# Altium footprint library VESC_MotorController.PcbLib: 146 footprints (part 1 of 10)
Each footprint in its own frame and in the unit in brackets; x right, y up, seen from the top. Pads: shape width x height; smd on the part's side, far side on the other; paste and mask are expansions set on the pad; w line width, h text height; cw(c..) or ccw(c..) is an arc to the next point about the centre after c.
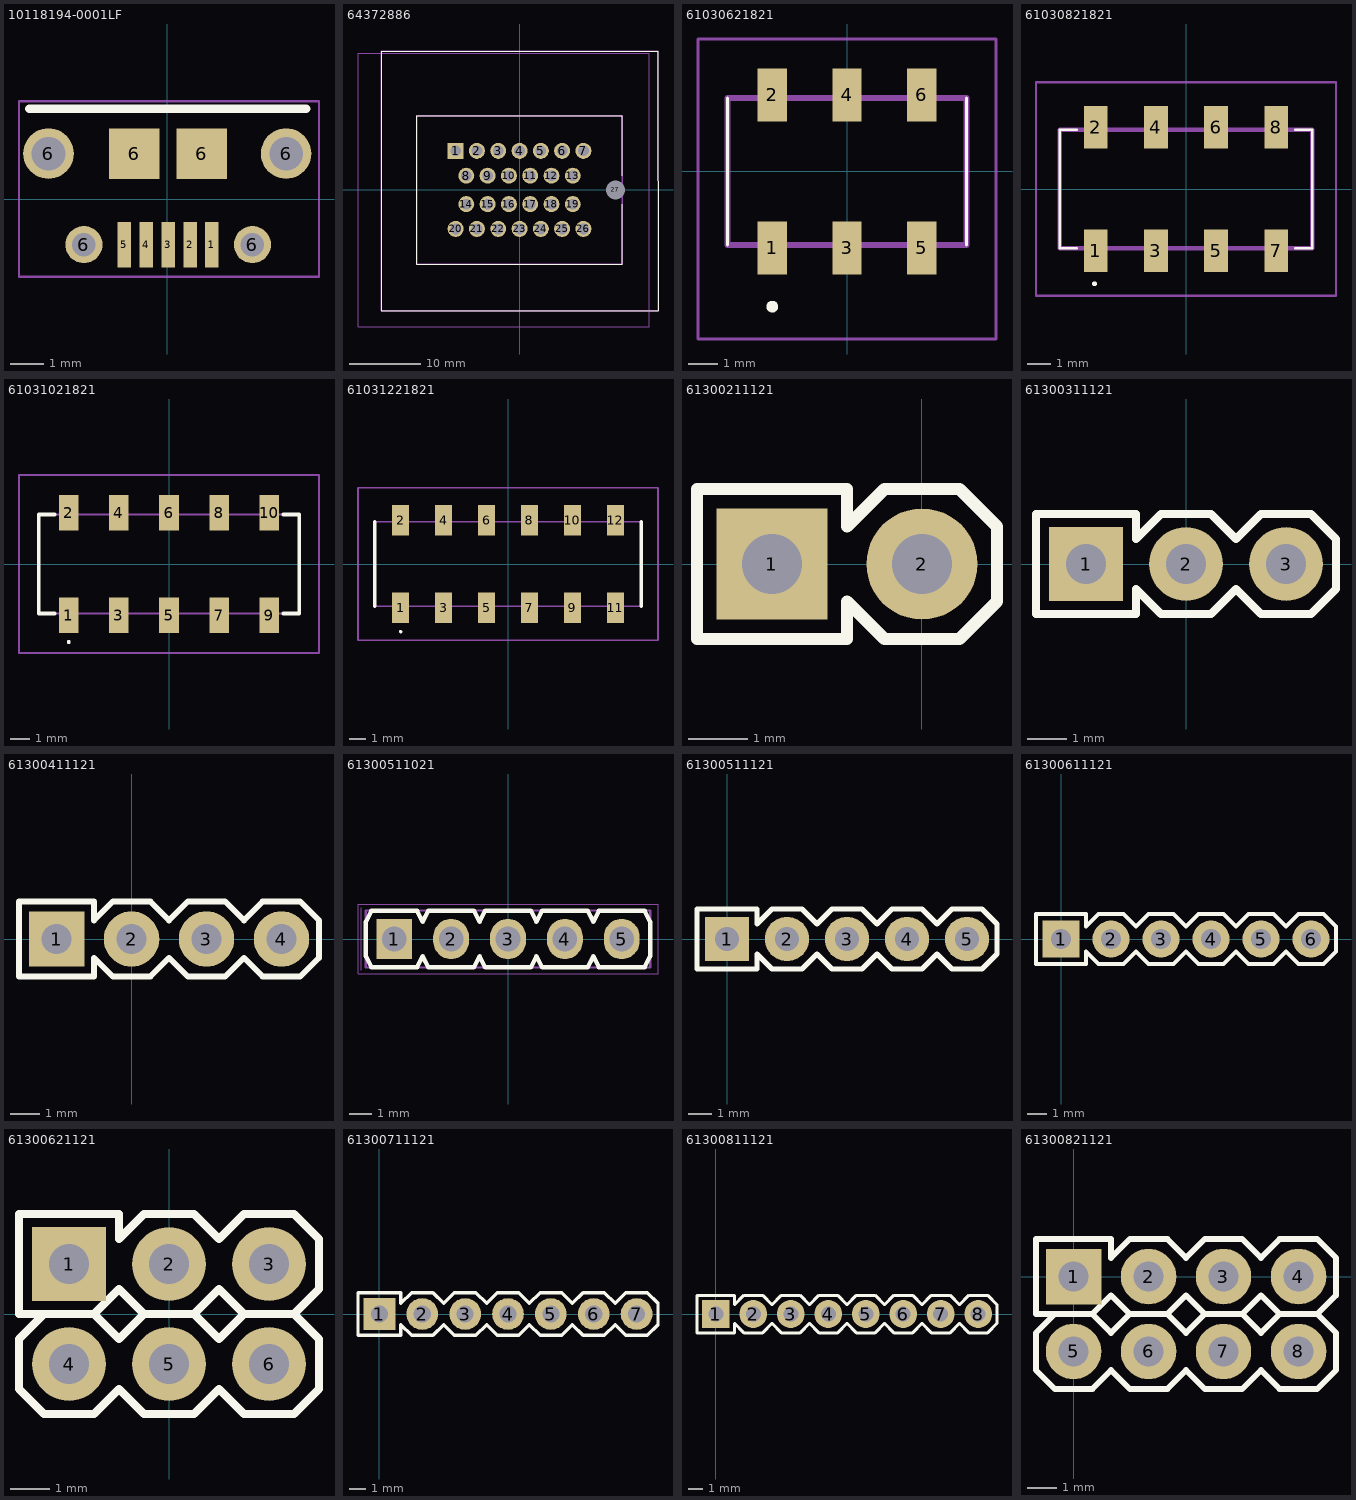
[diagram p0: the footprints below, top view; thin cyan lines are the x and y axes]

## 10118194-0001LF [mm] "CONN USB MICRO B RECPT SMT R/A"
pads (11):
  rect 0.4x1.35 smd: 1(1.325,-1.35) 2(0.675,-1.35) 3(0.025,-1.35) 4(-0.625,-1.35) 5(-1.275,-1.35)
  round 1.5 hole 1: 6(-3.525,1.35) 6(3.525,1.35)
  round 1.1 hole 0.7: 6(-2.475,-1.35) 6(2.525,-1.35)
  rect 1.5x1.5 smd: 6(-0.975,1.35) 6(1.025,1.35)
Top Overlay:
  lines w0.25: -4.1,2.675 4.125,2.675
Mechanical 15:
  lines w0.07: -4.4,-2.3 4.5,-2.3 4.5,2.9 -4.4,2.9 -4.4,-2.3
3D body "MICRO_USB_5PIN_0921_ASM.STEP": height 2.73, standoff -0.55, extent -4,-1.553 4.05,4.027

## 64372886 [mm]
pads (27):
  rect 2.25x2.25 hole 1.5: 1(-9,5.5)
  round 2.25 hole 1.5: 2(-6,5.5) 3(-3,5.5) 4(0,5.5) 5(3,5.5) 6(6,5.5) 7(9,5.5) 8(-7.5,2) 9(-4.5,2) 10(-1.5,2) 11(1.5,2) 12(4.5,2) 13(7.5,2) 14(-7.5,-2) 15(-4.5,-2) 16(-1.5,-2) 17(1.5,-2) 18(4.5,-2) 19(7.5,-2) 20(-9,-5.5) 21(-6,-5.5) 22(-3,-5.5) 23(0,-5.5) 24(3,-5.5) 25(6,-5.5) 26(9,-5.5)
  round 1.35 hole 2.7 unplated: 27(13.5,0)
Top Overlay:
  lines w0.1: 14.5,-2 14.5,-10.475 -14.5,-10.5 -14.5,10.475 14.5,10.475 14.5,2 ; -19.5,-17 -19.5,19.5 19.5,19.5 19.5,-17 -19.5,-17
Mechanical 15:
  lines w0.2: -19.5,-17 -19.5,19.5 19.5,19.5 19.5,-17 -19.5,-17 ; -14.5,-10.475 -14.5,10.475 14.5,10.475 14.5,-10.475 -14.5,-10.475
Mechanical 20:
  lines w0.1: -22.75,-19.25 -22.75,19.25 18.25,19.25 18.25,-19.25 -22.75,-19.25
3D body "6437288-6.stp": height 24.6, standoff -4.6, extent -19.5,-17.088 19.5,19.412

## 61030621821 [mm]
pads (6):
  rect 1x1.8 smd: 1(-2.54,-2.6) 2(-2.54,2.6) 3(0,-2.6) 4(0,2.6) 5(2.54,-2.6) 6(2.54,2.6)
Top Overlay:
  lines w0.1: -4.06,-2.5 -4.06,2.5 ; 4.06,-2.5 4.06,2.5
  lines w0.2: -2.54,-4.7 cw(c-2.54,-4.6) -2.54,-4.5 cw(c-2.54,-4.6) -2.54,-4.7
Mechanical 15:
  lines w0.2: -4.06,-2.5 4.06,-2.5 4.06,2.5 -4.06,2.5 -4.06,-2.5
Mechanical 20:
  lines w0.1: -5.06,-5.7 5.06,-5.7 5.06,4.5 -5.06,4.5 -5.06,-5.7
3D body "61030621821.stp": height 7.4, standoff -0.05, extent -4.055,-3.35 4.005,3.35

## 61030821821 [mm]
pads (8):
  rect 1x1.8 smd: 1(-3.81,-2.6) 2(-3.81,2.6) 3(-1.27,-2.6) 4(-1.27,2.6) 5(1.27,-2.6) 6(1.27,2.6) 7(3.81,-2.6) 8(3.81,2.6)
Top Overlay:
  lines w0.1: -4.6,-2.5 -5.33,-2.5 -5.33,2.5 -4.6,2.5 ; 4.6,-2.5 5.33,-2.5 5.33,2.5 4.6,2.5 ; -3.91,-4 ccw(c-3.86,-4) -3.81,-4 ccw(c-3.86,-4) -3.91,-4
Mechanical 15:
  lines w0.2: -5.33,-2.5 -5.33,2.5 5.33,2.5 5.33,-2.5 -5.33,-2.5
Mechanical 20:
  lines w0.1: -6.33,-4.5 -6.33,4.5 6.33,4.5 6.33,-4.5 -6.33,-4.5
3D body "61030821821.stp": height 7.5, standoff 0.05, extent -5.33,-3.35 5.33,3.35

## 61031021821 [mm]
pads (10):
  rect 1x1.8 smd: 1(-5.08,-2.6) 2(-5.08,2.6) 3(-2.54,-2.6) 4(-2.54,2.6) 5(0,-2.6) 6(0,2.6) 7(2.54,-2.6) 8(2.54,2.6) 9(5.08,-2.6) 10(5.08,2.6)
Top Overlay:
  lines w0.1: -5.08,-4 ccw(c-5.08,-3.95) -5.08,-3.9 ccw(c-5.08,-3.95) -5.08,-4
  lines w0.2: -5.8,-2.5 -6.6,-2.5 -6.6,2.5 -5.8,2.5 ; 5.8,-2.5 6.6,-2.5 6.6,2.5 5.8,2.5
Mechanical 15:
  lines w0.1: -6.6,-2.5 6.6,-2.5 6.6,2.5 -6.6,2.5 -6.6,-2.5
Mechanical 20:
  lines w0.1: -7.6,-4.5 7.6,-4.5 7.6,4.5 -7.6,4.5 -7.6,-4.5
3D body "61031021821.stp": height 7.4, standoff -0.05, extent -6.6,-3.35 6.6,3.35

## 61031221821 [mm]
pads (12):
  rect 1x1.8 smd: 1(-6.35,-2.6) 2(-6.35,2.6) 3(-3.81,-2.6) 4(-3.81,2.6) 5(-1.27,-2.6) 6(-1.27,2.6) 7(1.27,-2.6) 8(1.27,2.6) 9(3.81,-2.6) 10(3.81,2.6) 11(6.35,-2.6) 12(6.35,2.6)
Top Overlay:
  lines w0.1: -6.4,-4 ccw(c-6.35,-4) -6.3,-4 ccw(c-6.35,-4) -6.4,-4
  lines w0.2: -7.87,-2.5 -7.87,2.5 ; 7.87,-2.5 7.87,2.5
Mechanical 15:
  lines w0.1: -7.87,-2.5 -7.87,2.5 7.87,2.5 7.87,-2.5 -7.87,-2.5
Mechanical 20:
  lines w0.1: -8.87,-4.5 -8.87,4.5 8.87,4.5 8.87,-4.5 -8.87,-4.5
3D body "61031221821.stp": height 7.4, standoff -0.05, extent -7.87,-3.35 7.87,3.35

## 61300211121 [mil]
pads (2):
  rect 74x74 hole 40: 1(-100,0)
  round 74 hole 40: 2(0,0)
Top Overlay:
  lines w8: -150,-50 -50,-50 -50,-25 -25,-50 25,-50 50,-25 50,25 25,50 -25,50 -50,25 -50,50 -150,50 -150,-50
Mechanical 13:
  region: -90,-10 -110,-10 -110,10 -90,10
  region: 10,-10 -10,-10 -10,10 10,10
3D body "61300211121.stp": height 337.4, standoff -116.93, extent -150,-50 50,50

## 61300311121 [mil]
pads (3):
  rect 74x74 hole 40: 1(-100,0)
  round 74 hole 40: 2(0,0) 3(100,0)
Top Overlay:
  lines w8: -150,-50 -150,50 -50,50 -50,25 -25,50 25,50 50,25 75,50 125,50 150,25 150,-25 125,-50 75,-50 50,-25 25,-50 -25,-50 -50,-25 -50,-50 -150,-50
Mechanical 13:
  region: 110,-10 90,-10 90,10 110,10
  region: 10,-10 -10,-10 -10,10 10,10
  region: -90,-10 -110,-10 -110,10 -90,10
3D body "61300311121.stp": height 341.34, standoff -112.99, extent -150,-49.99 150,50.01

## 61300411121 [mil]
pads (4):
  rect 74x74 hole 40: 1(-100,0)
  round 74 hole 40: 2(0,0) 3(100,0) 4(200,0)
Top Overlay:
  lines w8: -150,-50 -150,50 -50,50 -50,25 -25,50 25,50 50,25 75,50 125,50 150,25 175,50 225,50 250,25 250,-25 225,-50 175,-50 150,-25 125,-50 75,-50 50,-25 25,-50 -25,-50 -50,-25 -50,-50 -150,-50
Mechanical 13:
  region: 210,-10 190,-10 190,10 210,10
  region: 110,-10 90,-10 90,10 110,10
  region: 10,-10 -10,-10 -10,10 10,10
  region: -90,-10 -110,-10 -110,10 -90,10
3D body "61300411121.stp": height 341.34, standoff -112.99, extent -149.99,-49.99 250.01,50.01

## 61300511021 [mm] "Pin Header, pitch 2.54 mm, THT, Vertical, single row, 5p"
height 8.54
pads (5):
  rect 1.6x1.8 hole 1.1: 1(-5.08,0)
  oval 1.6x1.8 hole 1.1: 2(-2.54,0) 3(0,0) 4(2.54,0) 5(5.08,0)
Top Overlay:
  lines w0.2: -6.35,-0.77 -6.1,-1.27 -4.06,-1.27 -3.81,-0.77 -3.56,-1.27 -1.52,-1.27 -1.27,-0.77 -1.02,-1.27 1.02,-1.27 1.27,-0.77 1.52,-1.27 3.56,-1.27 3.81,-0.77 4.06,-1.27 6.1,-1.27 6.35,-0.77 6.35,0.77 6.1,1.27 4.06,1.27 3.81,0.77 3.56,1.27 1.52,1.27 1.27,0.77 1.02,1.27 -1.02,1.27 -1.27,0.77 -1.52,1.27 -3.56,1.27 -3.81,0.77 -4.06,1.27 -6.1,1.27 -6.35,0.77 -6.35,-0.77
Mechanical 13:
  lines w0.1: 6.1,-1.27 4.06,-1.27 3.81,-0.77 3.56,-1.27 1.52,-1.27 1.27,-0.77 1.02,-1.27 -1.02,-1.27 -1.27,-0.77 -1.52,-1.27 -3.56,-1.27 -3.81,-0.77 -4.06,-1.27 -6.1,-1.27 -6.35,-0.77 -6.35,0.77 -6.1,1.27 -4.06,1.27 -3.81,0.77 -3.56,1.27 -1.52,1.27 -1.27,0.77 -1.02,1.27 1.02,1.27 1.27,0.77 1.52,1.27 3.56,1.27 3.81,0.77 4.06,1.27 6.1,1.27 ; -6.35,-1.27 -6.35,1.27 6.35,1.27 6.35,-1.27 -6.35,-1.27
Mechanical 14:
  text ".Designator" at -0.309,-0.098 h0.75
Mechanical 15:
  lines w0.05: -6.55,-1.4 -6.55,1.4 ; -0.5,0 0.5,0 ; 0,-0.5 0,0.5 ; -6.7,-1.545 -6.7,1.545 6.7,1.545 6.7,-1.545 -6.7,-1.545
3D body "61300511021 (rev1).stp": height 2.55, standoff -2.99, extent -6.35,-0.423 6.35,9.937

## 61300511121 [mil]
pads (5):
  rect 74x74 hole 40: 1(0,0)
  round 74 hole 40: 2(100,0) 3(200,0) 4(300,0) 5(400,0)
Top Overlay:
  lines w8: -50,-50 50,-50 50,-25 75,-50 125,-50 150,-25 175,-50 225,-50 250,-25 275,-50 325,-50 350,-25 375,-50 425,-50 450,-25 450,25 425,50 375,50 350,25 325,50 275,50 250,25 225,50 175,50 150,25 125,50 75,50 50,25 50,50 -50,50 -50,-50
3D body "61300511121.stp": height 341.34, standoff -112.99, extent -49.99,-49.99 450.01,50.01

## 61300611121 [mil]
pads (6):
  rect 74x74 hole 40: 1(0,0)
  round 74 hole 40: 2(100,0) 3(200,0) 4(300,0) 5(400,0) 6(500,0)
Top Overlay:
  lines w8: -50,-50 -50,50 50,50 50,25 75,50 125,50 150,25 175,50 225,50 250,25 275,50 325,50 350,25 375,50 425,50 450,25 475,50 525,50 550,25 550,-25 525,-50 475,-50 450,-25 425,-50 375,-50 350,-25 325,-50 275,-50 250,-25 225,-50 175,-50 150,-25 125,-50 75,-50 50,-25 50,-50 -50,-50
3D body "61300611121.stp": height 342.13, standoff -125.98, extent -50,-50 550,50

## 61300621121 [mil]
pads (6):
  rect 74x74 hole 40: 1(-100,50)
  round 74 hole 40: 2(0,50) 3(100,50) 4(-100,-50) 5(0,-50) 6(100,-50)
Top Overlay:
  lines w8: -125,0 -150,-25 -150,-75 -125,-100 -75,-100 -50,-75 -25,-100 25,-100 50,-75 75,-100 125,-100 150,-75 150,-25 125,0 ; -75,0 -50,-25 -25,0 ; -75,0 -150,0 -150,100 -50,100 -50,75 -25,100 25,100 50,75 75,100 125,100 150,75 150,25 125,0 ; -75,0 -50,25 -25,0 ; -25,0 25,0 ; 25,0 50,-25 75,0 ; 25,0 50,25 75,0 ; 75,0 125,0
3D body "61300621121.stp": height 350, standoff -125.98, extent -150,-100 150,100

## 61300711121 [mil]
pads (7):
  rect 74x74 hole 40: 1(0,0)
  round 74 hole 40: 2(100,0) 3(200,0) 4(300,0) 5(400,0) 6(500,0) 7(600,0)
Top Overlay:
  lines w8: -50,-50 50,-50 50,-25 75,-50 125,-50 150,-25 175,-50 225,-50 250,-25 275,-50 325,-50 350,-25 375,-50 425,-50 450,-25 475,-50 525,-50 550,-25 575,-50 625,-50 650,-25 650,25 625,50 575,50 550,25 525,50 475,50 450,25 425,50 375,50 350,25 325,50 275,50 250,25 225,50 175,50 150,25 125,50 75,50 50,25 50,50 -50,50 -50,-50
3D body "61300711121.stp": height 342.13, standoff -125.98, extent -50,-50 650,50

## 61300811121 [mil]
pads (8):
  rect 74x74 hole 40: 1(0,0)
  round 74 hole 40: 2(100,0) 3(200,0) 4(300,0) 5(400,0) 6(500,0) 7(600,0) 8(700,0)
Top Overlay:
  lines w8: -50,-50 50,-50 50,-25 75,-50 125,-50 150,-25 175,-50 225,-50 250,-25 275,-50 325,-50 350,-25 375,-50 425,-50 450,-25 475,-50 525,-50 550,-25 575,-50 625,-50 650,-25 675,-50 725,-50 750,-25 750,25 725,50 675,50 650,25 625,50 575,50 550,25 525,50 475,50 450,25 425,50 375,50 350,25 325,50 275,50 250,25 225,50 175,50 150,25 125,50 75,50 50,25 50,50 -50,50 -50,-50
3D body "61300811121.stp": height 336.22, standoff -118.11, extent -50,-50 750,50

## 61300821121 [mil]
pads (8):
  rect 74x74 hole 40: 1(0,0)
  round 74 hole 40: 2(100,0) 3(200,0) 4(300,0) 5(0,-100) 6(100,-100) 7(200,-100) 8(300,-100)
Top Overlay:
  lines w8: -25,-50 -50,-75 -50,-125 -25,-150 25,-150 50,-125 75,-150 125,-150 150,-125 175,-150 225,-150 250,-125 275,-150 325,-150 350,-125 350,-75 325,-50 ; 25,-50 50,-75 75,-50 ; 25,-50 -50,-50 -50,50 50,50 50,25 75,50 125,50 150,25 175,50 225,50 250,25 275,50 325,50 350,25 350,-25 325,-50 ; 25,-50 50,-25 75,-50 ; 75,-50 125,-50 ; 125,-50 150,-75 175,-50 ; 125,-50 150,-25 175,-50 ; 175,-50 225,-50 ; 225,-50 250,-75 275,-50 ; 225,-50 250,-25 275,-50 ; 275,-50 325,-50
3D body "61300821121.stp": height 333.46, standoff -120.87, extent -50.39,-148.43 349.61,51.57